# Altium footprint library CADTcommon.PcbLib: 503 footprints (part 32 of 32)
Each footprint in its own frame and in the unit in brackets; x right, y up, seen from the top. Pads: shape width x height; smd on the part's side, far side on the other; paste and mask are expansions set on the pad; w line width, h text height; cw(c..) or ccw(c..) is an arc to the next point about the centre after c.
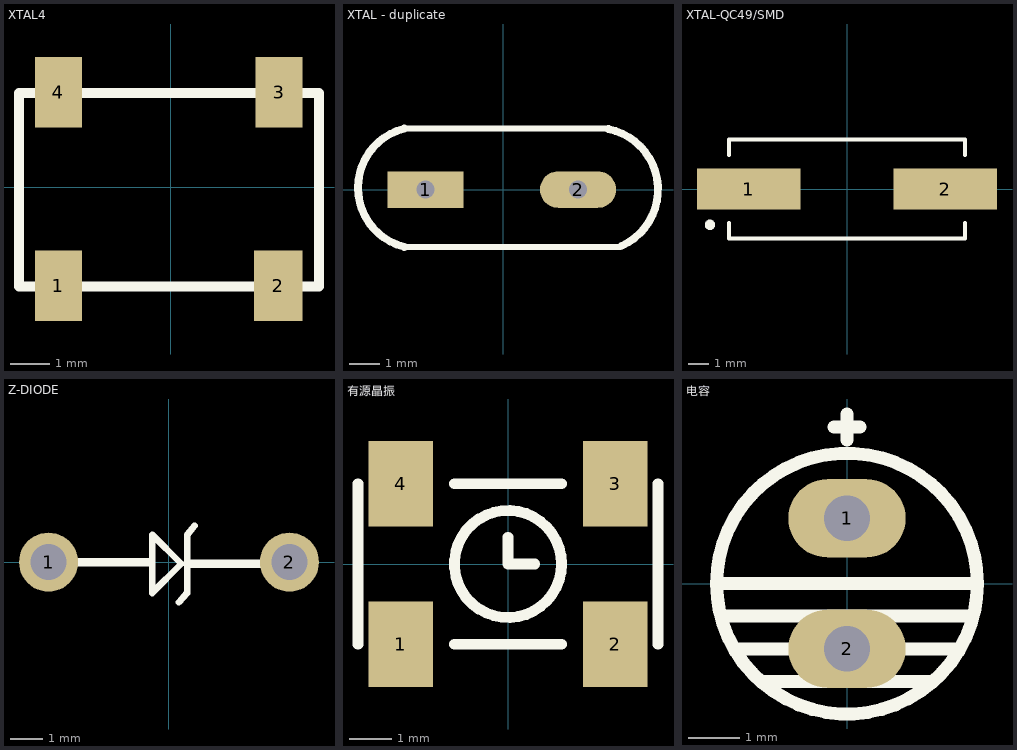
[diagram p31: the footprints below, top view; thin cyan lines are the x and y axes]

## XTAL4 [mil]
pads (4):
  rect 47.24x70 smd: 1(-112,-98) 3(108,95) 4(-112,95)
  rect 48.42x70 smd: 2(107,-98)
Top Overlay:
  lines w10: -151.37,-98.81 -151.37,94.1 147.84,94.1 147.84,-98.81 -151.37,-98.81

## XTAL - duplicate [mm]
pads (2):
  rect 2.5x1.2 hole 0.6: 1(-2.54,0)
  oval 2.5x1.2 hole 0.6: 2(2.46,0)
Top Overlay:
  lines w0.2: -3.24,-1.881 3.857,-1.881 3.897,-1.841 ; -3.24,2 3.46,2
  lines w0.254: -3.24,-1.881 cw(c-2.755,0.06) -3.24,2 ; 3.457,1.983 cw(c3.06,0) 3.897,-1.841

## XTAL-QC49/SMD [mm]
pads (2):
  rect 5x2 smd: 1(-4.75,0) 2(4.75,0)
Top Overlay:
  circle w0.25: c-6.625,-1.73 r0.125
  lines w0.2: -5.7,-1.65 -5.7,-2.4 5.7,-2.4 5.7,-1.65 ; -5.7,1.65 -5.7,2.4 5.7,2.4 5.7,1.65
3D body: height 4, standoff 0, extent -6.7,-2.462 6.7,2.438

## Z-DIODE [mm] "Z?"
pads (2):
  round 1.8 hole 1.1: 1(-3.664,0) 2(3.664,0)
Top Overlay:
  lines w0.2: 0.299,-1.219 0.553,-0.94 ; 0.776,1.106 0.553,0.838 ; 0.553,-0.94 0.553,-0.051 0.553,0.838 ; 0.553,-0.94 0.553,0.838 ; -0.514,-0.94 -0.514,0.838 0.375,-0.051 -0.514,-0.94
  lines w0.254: -2.775,0 -0.565,0 ; 0.553,-0.051 2.763,-0.051
3D body: height 1.83, standoff -1, extent -2.781,-0.837 2.731,0.813

## 散热片 [mm]
3D body: height 25, standoff -3.8, extent -7.544,-2.286 7.237,8.515

## 有源晶振 [mil]
pads (4):
  rect 60x80 smd: 1(-100,-75) 2(100,-75) 3(100,75) 4(-100,75)
Top Overlay:
  circle w10: c0,0 r50
  lines w10: -140,-75 -140,75 ; -50,-75 50,-75 ; -50,75 50,75 ; 0,25 0,0 25,0 ; 140,-75 140,75
3D body: height 73.62, standoff 10.63, extent -137.5,-98.43 138.09,98.43

## 电容 [mil]
pads (2):
  oval 90x60 hole 35: 1(0,50) 2(0,-50)
Top Overlay:
  circle w10: c0,0 r100
  lines w10: -100,0 100,0 ; -95,-25 95,-25 ; -85,-50 85,-50 ; -65,-75 65,-75 ; -10,120 10,120 ; 0,110 0,130
3D body: height 393.7, standoff 314.96, extent -12.48,-102.48 12.48,-77.52
3D body: height 236.22, standoff 157.48, extent -12.48,-102.48 12.48,-77.52
3D body: height 78.74, standoff 0, extent -12.48,-102.48 12.48,-77.52
3D body: height 433.07, standoff 0, extent -100.46,-100.46 100.47,100.47